# Altium integrated library CbyP.IntLib: 1144 symbols (part 3 of 6) (continued)
## CC0603JRNPO9BN560 (continued)
CAP CER 56pF 50V NP0 0603; Manufacturer: YAGEO; Mfr.Part #: CC0603JRNPO9BN560; Package: 0603; LCSC Part #: C107053
footprint CAP-0603
pins: 1, 2

## CC0603JRNPO9BN561
designator C?, comment 560pF
560pF ±5% 50V Ceramic Capacitor NP0 0603; Manufacturer: YAGEO; Mfr.Part #: CC0603JRNPO9BN561; Package: 0603; LCSC Part #: C107054; DigiKey Part Number: 311-3359-2-ND; ComponentLink1Description: Link; ComponentLink1URL: https://www.lcsc.com/product-detail/C107054.html?s_z=n_560PF; ComponentLink2Description: Link 1; ComponentLink2URL: https://www.digikey.com/en/products/detail/yageo/CC0603JRNPO9BN561/5883620?s=N4IgTCBcDaIMJwAwDZEGYBSAlAcgBQHkBOAIRwFZkBGEAXQF8g
footprint CAP-0603
pins: 1, 2

## CC0603JRNPO9BN750
designator C?, comment 75pF
75pF ±5% 50V Ceramic Capacitor NP0 0603; Manufacturer: YAGEO; Mfr.Part #: CC0603JRNPO9BN750; Package: 0603; LCSC Part #: C282074; DigiKey Part Number: 311-3975-2-ND
footprint CAP-0603
pins: 1, 2

## CC0603JRX7R9BB103
designator C?, comment 10nF
10nF ±5% 50V Ceramic Capacitor X7R 0603; Manufacturer: YAGEO; Mfr.Part #: CC0603JRX7R9BB103; Package: 0603; LCSC Part #: C115056; DigiKey Part Number: 311-1778-2-ND; ComponentLink1Description: Link; ComponentLink1URL: https://www.lcsc.com/product-detail/C115056.html?s_z=n_C115056; ComponentLink2Description: Link 1; ComponentLink2URL: https://www.digikey.com/en/products/detail/yageo/CC0603JRX7R9BB103/5195187?s=N4IgTCBcDaIMJwAwDZEGYBSAlAGgdiwE4AhYgRnRAF0BfIA
footprint CAP-0603
footprint CAP-0603-2
pins: 1, 2

## CC0603JRX7R9BB104
designator C?, comment 100nF
50V 100nF X7R ±5% 0603 Multilayer Ceramic Capacitors MLCC - SMD/SMT ROHS; Manufacturer: YAGEO; Mfr.Part #: CC0603JRX7R9BB104; Package: 0603; LCSC Part #: C14664
footprint CAP-0603
pins: 1, 2

## CC0603JRX7R9BB224
designator C?, comment 220nF
220nF ±5% 50V Ceramic Capacitor X7R 0603; Manufacturer: YAGEO; Mfr.Part #: CC0603JRX7R9BB224; Package: 0603; LCSC Part #: C519575; DigiKey Part Number: 13-CC0603JRX7R9BB224TR-ND; ComponentLink1Description: Link; ComponentLink1URL: https://www.lcsc.com/product-detail/C519575.html?s_z=n_CC0603JRX7R9BB224; ComponentLink2Description: Link 1; ComponentLink2URL: https://www.digikey.com/en/products/detail/yageo/CC0603JRX7R9BB224/11490865?s=N4IgTCBcDaIMJwAwDZEGYBSAlAGgdiwE4AhYsMAFhAF0BfIA
footprint CAP-0603
pins: 1, 2

## CC0603KRX5R6BB475
designator C?, comment 4.7uF
10V 4.7uF X5R ±10% 0603 Multilayer Ceramic Capacitors MLCC - SMD/SMT ROHS; Manufacturer: YAGEO; Mfr.Part #: CC0603KRX5R6BB475; Package: 0603; LCSC Part #: C109456
footprint CAP-0603
pins: 1, 2

## CC0603KRX5R7BB225
designator C?, comment 2.2uF
16V 2.2uF X5R ±10% 0603 Multilayer Ceramic Capacitors MLCC - SMD/SMT ROHS; Manufacturer: YAGEO; Mfr.Part #: CC0603KRX5R7BB225; Package: 0603; LCSC Part #: C106853; DigiKey Part Number: 311-1784-2-ND
footprint CAP-0603
pins: 1, 2

## CC0603KRX5R8BB105
designator C?, comment 1uF
1uF ±10% 25V Ceramic Capacitor X5R 0603; Manufacturer: YAGEO; Mfr.Part #: CC0603KRX5R8BB105; Package: 0603; LCSC Part #: C14664; DigiKey Part Number: 311-1445-2-ND; ComponentLink1Description: Link; ComponentLink1URL: https://www.lcsc.com/product-detail/C14664.html?s_z=n_C14664; ComponentLink2Description: Link 1; ComponentLink2URL: https://www.digikey.com/en/products/detail/yageo/CC0603KRX5R8BB105/2833610?s=N4IgTCBcDaIMJwAwDZEGYDSAlAGgViwA4AhYgRkTxAF0BfIA
footprint CAP-0603
pins: 1, 2

## CC0603KRX5R8BB225
designator C?, comment 2.2uF
CAP CER 2.2uF 25V X5R 0603; Manufacturer: YAGEO; Mfr.Part #: CC0603JRX7R9BB224; Package: 0603; LCSC Part #: C309478; DigiKey Part Number: 13-CC0603JRX7R9BB224TR-ND; ComponentLink1Description: Link; ComponentLink1URL: https://www.lcsc.com/product-detail/C309478.html?s_z=n_C309478; ComponentLink2Description: Link 1; ComponentLink2URL: https://www.digikey.com/en/products/detail/yageo/CC0603JRX7R9BB224/11490865?s=N4IgTCBcDaIMJwAwDZEGYBSAlAGgdiwE4AhYsMAFhAF0BfIA
footprint CAP-0603
pins: 1, 2

## CC0603KRX7R8BB684
designator C?, comment 680nF
680nF ±10% 25V Ceramic Capacitor X7R 0603; Manufacturer: YAGEO; Mfr.Part #: CC0603KRX7R8BB684; Package: 0603; LCSC Part #: C2838708
footprint CAP-0603
pins: 1, 2

## CC0603KRX7R9BB102
designator C?, comment 1nF
1nF ±10% 50V Ceramic Capacitor X7R 0603; Manufacturer: YAGEO; Mfr.Part #: CC0603KRX7R9BB102; Package: 0603; LCSC Part #: C100040; DigiKey Part Number: 311-1080-2-ND; ComponentLink1Description: Link; ComponentLink1URL: https://www.lcsc.com/product-detail/C100040.html?s_z=n_C100040; ComponentLink2Description: Link 1; ComponentLink2URL: https://www.digikey.com/en/products/detail/yageo/CC0603KRX7R9BB102/302814?s=N4IgTCBcDaIMJwAwDZEGYDSAlAGgdiwE4AhYgRkQgF0BfIA
footprint CAP-0603
pins: 1, 2

## CC0603KRX7R9BB104
designator C?, comment 100nF
100nF ±10% 50V Ceramic Capacitor X7R 0603; Manufacturer: YAGEO; Mfr.Part #: CC0603KRX7R9BB104; Package: 0603; LCSC Part #: C14663; DigiKey Part Number: 311-1344-2-ND; ComponentLink1Description: Link; ComponentLink1URL: https://www.lcsc.com/product-detail/C14663.html?s_z=n_C14663; ComponentLink2Description: Link 1; ComponentLink2URL: https://www.digikey.com/en/products/detail/yageo/CC0603KRX7R9BB104/2103082?s=N4IgTCBcDaIMwEYEFoFwCzuWZA5AIiALoC%2BQA
footprint CAP-0603
pins: 1, 2

## CC0603KRX7R9BB105
designator C?, comment 1uF
1uF ±10% 50V Ceramic Capacitor X7R 0603; Manufacturer: YAGEO; Mfr.Part #: CC0603KRX7R9BB105; Package: 0603; LCSC Part #: C559769; DigiKey Part Number: 311-2082-2-ND; ComponentLink1Description: Link; ComponentLink1URL: https://www.lcsc.com/product-detail/C559769.html?s_z=n_CC0603KRX7R9BB105; ComponentLink2Description: Link 1; ComponentLink2URL: https://www.digikey.com/en/products/detail/yageo/CC0603KRX7R9BB105/5883796?s=N4IgTCBcDaIMJwAwDZEGYDSAlAGgdiwE4AhYgRkQFYQBdAXyA
footprint CAP-0603
pins: 1, 2

## CC0603KRX7R9BB333
designator C?, comment 33nF
33nF ±10% 50V Ceramic Capacitor X7R 0603; Manufacturer: YAGEO; Mfr.Part #: CC0603KRX7R9BB333; Package: 0603; LCSC Part #: C106856; DigiKey Part Number: 311-1429-2-ND; ComponentLink1Description: Link; ComponentLink1URL: https://www.lcsc.com/product-detail/C106856.html?s_z=n_CC0603KRX7R9BB333; ComponentLink2Description: Link 1; ComponentLink2URL: https://www.digikey.com/en/products/detail/yageo/CC0603KRX7R9BB333/2833594?s=N4IgTCBcDaIMJwAwDZEGYDSAlAGgdiwE4AhYtckAXQF8g
footprint CAP-0603
pins: 1, 2

## CC0603KRX7R9BB473
designator C?, comment 47nF
47nF ±10% 50V Ceramic Capacitor X7R 0603; Manufacturer: Samsung Electro-Mechanics; Mfr.Part #: CC0603KRX7R9BB473; Package: 0603; LCSC Part #: C107093; DigiKey Part Number: 311-1427-2-ND; ComponentLink1Description: Link; ComponentLink1URL: https://www.lcsc.com/product-detail/C107093.html?s_z=n_47NF; ComponentLink2Description: Link 1; ComponentLink2URL: https://www.digikey.com/en/products/detail/yageo/CC0603KRX7R9BB473/2833592?s=N4IgTCBcDaIMJwAwDZEGYDSAlAGgdiwE4AhYgFjzRAF0BfIA
footprint CAP-0603
pins: 1, 2

## CC0603KRX7R9BB562
designator C?, comment 5.6nF
5.6nF ±10% 50V Ceramic Capacitor X7R 0603; Manufacturer: YAGEO; Mfr.Part #: CC0603KRX7R9BB562; Package: 0603; LCSC Part #: C107095; DigiKey Part Number: 311-1810-2-ND; ComponentLink1Description: Link; ComponentLink1URL: https://www.lcsc.com/product-detail/C107095.html?s_z=n_5600PF; ComponentLink2Description: Link 1; ComponentLink2URL: https://www.digikey.com/en/products/detail/yageo/CC0603KRX7R9BB562/5195217?s=N4IgTCBcDaIMJwAwDZEGYDSAlAGgdiwE4AhYgVmQgF0BfIA
footprint CAP-0603
pins: 1, 2

## CC0603KRX7R9BB563
designator C?, comment 56nF
56nF ±10% 50V Ceramic Capacitor X7R 0603; Manufacturer: YAGEO; Mfr.Part #: CC0603KRX7R9BB563; Package: 0603; LCSC Part #: C282072; DigiKey Part Number: 311-4100-2-ND; ComponentLink1Description: Link; ComponentLink1URL: https://www.lcsc.com/product-detail/C282072.html?s_z=n_56NF; ComponentLink2Description: Link 1; ComponentLink2URL: https://www.digikey.com/en/products/detail/yageo/CC0603KRX7R9BB563/5883809?s=N4IgTCBcDaIMJwAwDZEGYDSAlAGgdiwE4AhYgVmTRAF0BfIA
footprint CAP-0603
pins: 1, 2

## CC0603KRX7R9BB823
designator C?, comment 82nF
82nF ±10% 50V Ceramic Capacitor X7R 0603; Manufacturer: YAGEO; Mfr.Part #: CC0603KRX7R9BB823; Package: 0603; LCSC Part #: C107100; DigiKey Part Number: 311-4102-2-ND; ComponentLink1Description: Link; ComponentLink1URL: https://www.lcsc.com/product-detail/C107100.html?s_z=n_0.082UF; ComponentLink2Description: Link 1; ComponentLink2URL: https://www.digikey.com/en/products/detail/yageo/CC0603KRX7R9BB823/5883812?s=N4IgTCBcDaIMJwAwDZEGYDSAlAGgdiwE4AhYgDjDRAF0BfIA
footprint CAP-0603
pins: 1, 2

## CC0603ZRY5V6BB105
designator C?, comment 1uF
1uF -20%~+80% 10V Ceramic Capacitor Y5V 0603; Manufacturer: YAGEO; Mfr.Part #: CC0603ZRY5V6BB105; Package: 0603; LCSC Part #: C106220; DigiKey Part Number: 311-1357-2-ND; ComponentLink1Description: Link; ComponentLink1URL: https://www.lcsc.com/product-detail/C106220.html?s_z=n_C106220; ComponentLink2Description: Link 1; ComponentLink2URL: https://www.digikey.com/en/products/detail/yageo/CC0603ZRY5V6BB105/2103095?s=N4IgTCBcDaIMJwAwDZEGYBaAlAmgVgDVkAhYgRkTxAF0BfIA
footprint CAP-0603
pins: 1, 2

## CC0805JRNPO9BN220
designator C?, comment 22pF
22pF ±5% 50V Ceramic Capacitor NP0 0805; Manufacturer: YAGEO; Mfr.Part #: CC0805JRNPO9BN220; Package: 0805; LCSC Part #: C105623; DigiKey Part Number: 311-1103-2-ND
footprint CAP-0805
footprint CAP-0805-1
pins: 1, 2

## CC0805KKX7R7BB475
designator C?, comment 4.7uF
4.7uF ±10% 16V Ceramic Capacitor X7R 0805; Manufacturer: YAGEO; Mfr.Part #: CC0805KKX7R7BB475; Package: 0805; LCSC Part #: C277499; DigiKey Part Number: 311-1883-2-ND
footprint CAP-0805
footprint CAP-0805-1
pins: 1, 2

## CC0805KRX7R9BB103
designator C?, comment 10nF
10nF ±10% 50V Ceramic Capacitor X7R 0805; Manufacturer: YAGEO; Mfr.Part #: CC0805KRX7R9BB103; Package: 0805; LCSC Part #: C83170; DigiKey Part Number: 311-1136-2-ND
footprint CAP-0805
footprint CAP-0805-1
pins: 1, 2

## CC0805KRX7R9BB104
designator C?, comment 100nF
50V 100nF X7R ±10% 0805 Multilayer Ceramic Capacitors MLCC - SMD/SMT ROHS; Manufacturer: YAGEO; Mfr.Part #: CC0805KRX7R9BB104; Package: 0805; LCSC Part #: C49678; DigiKey Part Number: 311-1140-2-ND
footprint CAP-0805
footprint CAP-0805-1
pins: 1, 2

## CC1206JKNPOCBN101
designator C?, comment 100pF
100pF ±5% 1kV Ceramic Capacitor NP0 1206; Manufacturer: YAGEO; Mfr.Part #: CC1206JKNPOCBN101; Package: 1206; LCSC Part #: C107173; DigiKey Part Number: 311-1493-2-ND
footprint CAP-1206 - 1
pins: 1, 2

## CC1206KKX7R0BB224
designator C?, comment 220nF
220nF ±10% 100V Ceramic Capacitor X7R 1206; Manufacturer: YAGEO; Mfr.Part #: CC1206KKX7R0BB224; Package: 1206; LCSC Part #: C113892; DigiKey Part Number: 311-3399-2-ND; ComponentLink1Description: Link; ComponentLink1URL: https://www.lcsc.com/product-detail/C113892.html; ComponentLink2Description: Link 1; ComponentLink2URL: https://www.digikey.com/en/products/detail/yageo/CC1206KKX7R0BB224/5884562?s=N4IgTCBcDaIMJwIxgAwDYDSGAaB2ASigEJFhgAsIAugL5A
footprint CAP-1206 - 1
pins: 1, 2

## CC1206KKX7RCBB222
designator C?, comment 2.2nF
CAP CER 2.2nF 1kV X7R 1206; Manufacturer: YAGEO; Mfr.Part #: CC1206KKX7RCBB222; Package: 1206; LCSC Part #: C107194
footprint CAP-1206 - 1
pins: 1, 2

## CC1206KKX7RDBB102
designator C?, comment 1nF
1nF ±10% 2kV Ceramic Capacitor X7R 1206; Manufacturer: YAGEO; Mfr.Part #: CC1206KKX7RDBB102; Package: 1206; LCSC Part #: C23631; DigiKey Part Number: 311-1487-2-ND; ComponentLink1Description: Link; ComponentLink1URL: https://www.lcsc.com/product-detail/C23631.html?s_z=n_q_C23631&globalKeyword=C23631; ComponentLink2Description: Link 1; ComponentLink2URL: https://www.digikey.com/en/products/detail/yageo/CC1206KKX7RDBB102/2833652?s=N4IgTCBcDaIMJwIxgAwDYDSGAaB2ASgCIBCxiKEAugL5A
footprint CAP-1206 - 1
pins: 1, 2

## CC1206KRX7R9BB104
designator C?, comment 100nF
100nF ±10% 50V Ceramic Capacitor X7R 1206; Manufacturer: YAGEO; Mfr.Part #: CC1206KRX7R9BB104; Package: 1206; LCSC Part #: C82601; DigiKey Part Number: 311-1179-2-ND
footprint CAP-1206 - 1
pins: 1, 2

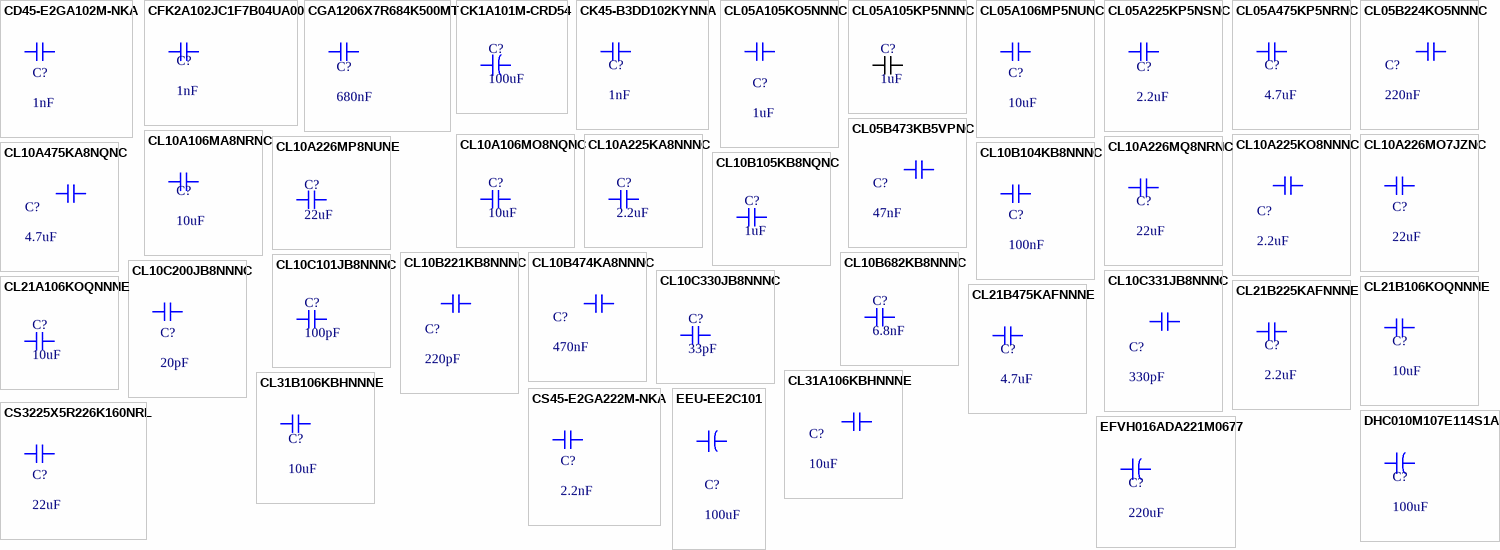
[diagram p16: symbols CD45-E2GA102M-NKA to EFVH016ADA221M0677]

## CD45-E2GA102M-NKA
designator C?, comment 1nF
CAP SAFETY 1nF ±20% 440V 400V TH; Manufacturer: TDK; Mfr.Part #: CD45-E2GA102M-NKA; Package: Through Hole,P=10mm; LCSC Part #: C360355
footprint Through Hole, P=7.5mm, D=8mm, T=5mm
pins: 1, 2

## CFK2A102JC1F7B04UA00
designator C?, comment 1nF
±5% 100V 1nF Through Hole,P=5.08mm Film Capacitors ROHS; Manufacturer: Dersonic; Mfr.Part #: CFK2A102JC1F7B04UA00; Package: Through Hole,P=5.08mm; LCSC Part #: C22439655
footprint Through Hole, P=5.08mm, L=7.2mm, W=2.5mm, H=6.5mm
pins: 1, 2

## CGA1206X7R684K500MT
designator C?, comment 680nF
680nF ±10% 50V Ceramic Capacitor X7R 1206; Manufacturer: HRE; Mfr.Part #: CGA1206X7R684K500MT; Package: 1206; LCSC Part #: C22440595; DigiKey Part Number: NO
footprint CAP-1206 - 1
pins: 1, 2

## CK1A101M-CRD54
designator C?, comment 100uF
100uF ±20% 10V Aluminum Electrolytic Capacitors 2000hrs@105℃; Manufacturer: ROQANG; Mfr.Part #: CK1A101M-CRD54; Package: SMD,D5xL5.4mm; LCSC Part #: C3001231; DigiKey Part Number: NO
footprint SMD,D5xL5.5mm
pins: 1, 2

## CK45-B3DD102KYNNA
designator C?, comment 1nF
CAP CER 1nF 2kV TH; Manufacturer: TDK; Mfr.Part #: CK45-B3DD102KYNNA; Package: Through Hole,P=5mm; LCSC Part #: C97722
footprint Through Hole, P=5mm, D=7.5mm, T=5mm
pins: 1, 2

## CL05A105KO5NNNC
designator C?, comment 1uF
16V 1uF X5R ±10% 0402 Ceramic Capacitors ROHS; Manufacturer: Samsung Electro-Mechanics; Mfr.Part #: CL05A105KO5NNNC; Package: 0402; LCSC Part #: C29266; DigiKey Part Number: 1276-1067-2-ND
footprint CAP-0402
pins: 1, 2

## CL05A105KP5NNNC
designator C?, comment 1uF
10V 1uF X5R ±10% 0402 Multilayer Ceramic Capacitors MLCC - SMD/SMT ROHS; Manufacturer: Samsung Electro-Mechanics; Mfr.Part #: CL05A105KP5NNNC; Package: 0402; LCSC Part #: C14445
footprint CAP-0402
pins: 1, 2

## CL05A106MP5NUNC
designator C?, comment 10uF
10V 10uF X5R ±20% 0402 Multilayer Ceramic Capacitors MLCC - SMD/SMT ROHS; Manufacturer: Samsung Electro-Mechanics; Mfr.Part #: CL05A106MP5NUNC; Package: 0402; LCSC Part #: C315248; DigiKey Part Number: 1276-1450-2-ND
footprint CAP-0402
pins: 1, 2

## CL05A225KP5NSNC
designator C?, comment 2.2uF
10V 2.2uF X5R ±10% 0402 Ceramic Capacitors RoHS; Manufacturer: Samsung Electro-Mechanics; Mfr.Part #: CL05A225KP5NSNC; Package: 0402; LCSC Part #: C107369; DigiKey Part Number: 1276-1108-2-ND
footprint CAP-0402
pins: 1, 2

## CL05A475KP5NRNC
designator C?, comment 4.7uF
10V 4.7uF X5R ±10% 0402 Multilayer Ceramic Capacitors MLCC - SMD/SMT ROHS; Manufacturer: Samsung Electro-Mechanics; Mfr.Part #: CL05A475KP5NRNC; Package: 0402; LCSC Part #: C368809; DigiKey Part Number: 1276-1480-2-ND
footprint CAP-0402
pins: 1, 2

## CL05B224KO5NNNC
designator C?, comment 220nF
220nF ±10% 16V Ceramic Capacitor X7R 0402; Manufacturer: Samsung Electro-Mechanics; Mfr.Part #: CL05B224KO5NNNC; Package: 0402; LCSC Part #: C16772; DigiKey Part Number: 1276-1176-2-ND; ComponentLink1Description: Link; ComponentLink1URL: https://www.lcsc.com/product-detail/C16772.html?s_z=n_220NF; ComponentLink2Description: Link 1; ComponentLink2URL: https://www.digikey.com/en/products/detail/samsung-electro-mechanics/CL05B224KO5NNNC/3886834?s=N4IgTCBcDaIMIBkAMBWAQmMAWA0geRQDli4QBdAXyA
footprint CAP-0402
pins: 1, 2

## CL05B473KB5VPNC
designator C?, comment 47nF
47nF ±10% 50V Ceramic Capacitor X7R 0402; Manufacturer: muRata; Mfr.Part #: CL05B473KB5VPNC; Package: 0402; LCSC Part #: C307339; DigiKey Part Number: 1276-CL05B473KB5VPNCTR-ND; ComponentLink1Description: Link; ComponentLink1URL: https://www.lcsc.com/product-detail/C307339.html; ComponentLink2Description: Link 1; ComponentLink2URL: https://www.digikey.com/en/products/detail/samsung-electro-mechanics/CL05B473KB5VPNC/11487772?s=N4IgTCBcDaIMIBkAMBWAQgFgOwGYDSaKAagAoBycIAugL5A
footprint CAP-0402
pins: 1, 2

## CL10A106MA8NRNC
designator C?, comment 10uF
10uF ±20% 25V Ceramic Capacitor X5R 0603; Manufacturer: Samsung Electro-Mechanics; Mfr.Part #: CL10A106MA8NRNC; Package: 0603; LCSC Part #: C96446; DigiKey Part Number: 1276-1869-2-ND; ComponentLink1Description: Link; ComponentLink1URL: https://www.lcsc.com/product-detail/C96446.html?s_z=n_CL10A106MA8NRNC; ComponentLink2Description: Link 1; ComponentLink2URL: https://www.digikey.com/en/products/detail/samsung-electro-mechanics/CL10A106MA8NRNC/3887527?s=N4IgTCBcDaIMIBkCMAGAgqgbAWTQDgDkAlAuEAXQF8g
footprint CAP-0603
pins: 1, 2

## CL10A106MO8NQNC
designator C?, comment 10uF
16V 10uF X5R ±20% 0603 Multilayer Ceramic Capacitors MLCC - SMD/SMT ROHS; Manufacturer: Samsung Electro-Mechanics; Mfr.Part #: CL10A106MO8NQNC; Package: 0603; LCSC Part #: C92487; DigiKey Part Number: 1276-1870-2-ND; ComponentLink1Description: Link; ComponentLink1URL: https://www.lcsc.com/product-detail/C92487.html?s_z=n_C92487; ComponentLink2Description: Link 1; ComponentLink2URL: https://www.digikey.com/en/products/detail/samsung-electro-mechanics/CL10A106MO8NQNC/3887528?s=N4IgTCBcDaIMIBkCMAGAgqgbAWQPIA4A5ARULhAF0BfIA
footprint CAP-0603
pins: 1, 2

## CL10A225KA8NNNC
designator C?, comment 2.2uF
2.2uF ±10% 25V Ceramic Capacitor X5R 0603; Manufacturer: Samsung Electro-Mechanics; Mfr.Part #: CL10A225KA8NNNC; Package: 0603; LCSC Part #: C57895; DigiKey Part Number: 1276-1879-2-ND; ComponentLink1Description: Link; ComponentLink1URL: https://www.lcsc.com/product-detail/C57895.html?s_z=n_CL10A225KA8NNNC; ComponentLink2Description: Link 1; ComponentLink2URL: https://www.digikey.com/en/products/detail/samsung-electro-mechanics/CL10A225KA8NNNC/3887537?s=N4IgTCBcDaIMIBkCMAGAgmMBWA0mgHAHLFwgC6AvkA
footprint CAP-0603
pins: 1, 2

## CL10A225KO8NNNC
designator C?, comment 2.2uF
2.2uF ±10% 16V Ceramic Capacitor X5R 0603; Manufacturer: Samsung Electro-Mechanics; Mfr.Part #: CL10A225KO8NNNC; Package: 0603; LCSC Part #: C23630; DigiKey Part Number: 1276-1040-2-ND; ComponentLink1Description: Link; ComponentLink1URL: https://www.lcsc.com/product-detail/C23630.html?s_z=n_CL10A225KO8NNNC; ComponentLink2Description: Link 1; ComponentLink2URL: https://www.digikey.com/en/products/detail/samsung-electro-mechanics/CL10A225KO8NNNC/3886698?s=N4IgTCBcDaIMIBkCMAGAgmMBWA0geQA4A5EuEAXQF8g
footprint CAP-0603
pins: 1, 2

## CL10A226MO7JZNC
designator C?, comment 22uF
16V 22uF X5R ±20% 0603 Ceramic Capacitors ROHS; Manufacturer: Samsung Electro-Mechanics; Mfr.Part #: CL10A226MO7JZNC; Package: 0603; LCSC Part #: C2762594; DigiKey Part Number: 1276-7076-2-ND
footprint CAP-0603
pins: 1, 2

## CL10A226MP8NUNE
designator C?, comment 22uF
10V 22uF X5R ±20% 0603 Multilayer Ceramic Capacitors MLCC - SMD/SMT ROHS; Manufacturer: Samsung Electro-Mechanics; Mfr.Part #: CL10A226MP8NUNE; Package: 0603; LCSC Part #: C86295; DigiKey Part Number: 1276-1274-2-ND
footprint CAP-0603
pins: 1, 2

## CL10A226MQ8NRNC
designator C?, comment 22uF
6.3V 22uF X5R ±20% 0603 Multilayer Ceramic Capacitors MLCC - SMD/SMT ROHS; Manufacturer: Samsung Electro-Mechanics; Mfr.Part #: CL10A226MQ8NRNC; Package: 0603; DigiKey Part Number: 1276-1193-2-ND; LCSC Part #: C59461
footprint CAP-0603
pins: 1, 2

## CL10A475KA8NQNC
designator C?, comment 4.7uF
4.7uF ±10% 25V Ceramic Capacitor X5R 0603; Manufacturer: Samsung Electro-Mechanics; Mfr.Part #: CL10A475KA8NQNC; Package: 0603; LCSC Part #: C69335; DigiKey Part Number: 1276-1900-2-ND; ComponentLink1Description: Link; ComponentLink1URL: https://www.lcsc.com/product-detail/C69335.html; ComponentLink2Description: Link 1; ComponentLink2URL: https://www.digikey.com/en/products/detail/samsung-electro-mechanics/CL10A475KA8NQNC/3887558?s=N4IgTCBcDaIMIBkCMAGAggFgOwFYDSaAHAHICKxcIAugL5A
footprint CAP-0603
pins: 1, 2

## CL10B104KB8NNNC
designator C?, comment 100nF
100nF ±10% 50V Ceramic Capacitor X7R 0603; Manufacturer: Samsung Electro-Mechanics; Mfr.Part #: CL10B104KB8NNNC; Package: 0603; LCSC Part #: C1591; DigiKey Part Number: 1276-1000-2-ND; ComponentLink1Description: Link; ComponentLink1URL: https://www.lcsc.com/product-detail/C1591.html?s_z=n_CL10B104KB8NNC; ComponentLink2Description: Link 1; ComponentLink2URL: https://www.digikey.com/en/products/detail/samsung-electro-mechanics/CL10B104KB8NNNC/3886658?s=N4IgTCBcDaIMIBkCMAGAQqgLAaTQDgDki4QBdAXyA
footprint CAP-0603
footprint CAP-0603-3
pins: 1, 2

## CL10B105KB8NQNC
designator C?, comment 1uF
1uF ±10% 50V Ceramic Capacitor X7R 0603; Manufacturer: Samsung Electro-Mechanics; Mfr.Part #: CL10B105KB8NQNC; Package: 0603; LCSC Part #: C5199872; DigiKey Part Number: NO; ComponentLink1Description: Link; ComponentLink1URL: https://www.lcsc.com/product-detail/C5199872.html; ComponentLink2Description: Link 1
footprint CAP-0603
pins: 1, 2

## CL10B221KB8NNNC
designator C?, comment 220pF
220pF ±10% 50V Ceramic Capacitor X7R 0603; Manufacturer: Samsung Electro-Mechanics; Mfr.Part #: CL10B221KB8NNNC; Package: 0603; LCSC Part #: C1603; DigiKey Part Number: 1276-1145-2-ND; ComponentLink1Description: Link; ComponentLink1URL: https://www.lcsc.com/product-detail/C1603.html?s_z=n_220PF; ComponentLink2Description: Link 1; ComponentLink2URL: https://www.digikey.com/en/products/detail/samsung-electro-mechanics/CL10B221KB8NNNC/3886803?s=N4IgTCBcDaIMIBkCMAGAQmMSDSaAcAckXCALoC%2BQA
footprint CAP-0603
pins: 1, 2

## CL10B474KA8NNNC
designator C?, comment 470nF
470nF ±10% 25V Ceramic Capacitor X7R 0603; Manufacturer: Samsung Electro-Mechanics; Mfr.Part #: CL10B474KA8NNNC; Package: 0603; LCSC Part #: C1623; DigiKey Part Number: 1276-2083-2-ND; ComponentLink1Description: Link; ComponentLink1URL: https://www.lcsc.com/product-detail/C1623.html?s_z=n_470NF; ComponentLink2Description: Link 1; ComponentLink2URL: https://www.digikey.com/en/products/detail/samsung-electro-mechanics/CL10B474KA8NNNC/3887741?s=N4IgTCBcDaIMIBkCMAGAQgFgOwYNIEEAOAOVLhAF0BfIA
footprint CAP-0603
pins: 1, 2

## CL10B682KB8NNNC
designator C?, comment 6.8nF
6.8nF ±10% 50V Ceramic Capacitor X7R 0603; Manufacturer: Samsung Electro-Mechanics; Mfr.Part #: CL10B682KB8NNNC; Package: 0603; LCSC Part #: C84723; DigiKey Part Number: 1276-1185-2-ND; ComponentLink1Description: Link; ComponentLink1URL: https://www.lcsc.com/product-detail/C84723.html?s_z=n_CL10B682KB; ComponentLink2Description: Link 1; ComponentLink2URL: https://www.digikey.com/en/products/detail/samsung-electro-mechanics/CL10B682KB8NNNC/3886843?s=N4IgTCBcDaIMIBkCMAGAQgNgBxgNJqwDli4QBdAXyA
footprint CAP-0603
pins: 1, 2

## CL10C101JB8NNNC
designator C?, comment 100pF
100pF ±5% 50V Ceramic Capacitor C0G 0603; Manufacturer: Samsung Electro-Mechanics; Mfr.Part #: CL10C101JB8NNNC; Package: 0603; LCSC Part #: C14858; DigiKey Part Number: 1276-1008-2-ND; ComponentLink1Description: Link; ComponentLink1URL: https://www.lcsc.com/product-detail/C14858.html?s_z=n_CL10C101JBNNNC; ComponentLink2Description: Link 1; ComponentLink2URL: https://www.digikey.com/en/products/detail/samsung-electro-mechanics/CL10C101JB8NNNC/3886666?s=N4IgTCBcDaIMIBkCMAGOqkCkBCAOAcoXCALoC%2BQA
footprint CAP-0603
pins: 1, 2

## CL10C200JB8NNNC
designator C?, comment 20pF
20pF ±5% 50V Ceramic Capacitor C0G 0603; Manufacturer: Samsung Electro-Mechanics; Mfr.Part #: CL10C200JB8NNNC; Package: 0603; LCSC Part #: C1648; DigiKey Part Number: 1276-1187-2-ND; ComponentLink1Description: Link; ComponentLink1URL: https://www.lcsc.com/product-detail/C1648.html?s_z=n_20pf; ComponentLink2Description: Link 1; ComponentLink2URL: https://www.digikey.com/en/products/detail/samsung-electro-mechanics/CL10C200JB8NNNC/3886845?s=N4IgTCBcDaIMIBkCMAGOYUoFICEAcAckXCALoC%2BQA
footprint CAP-0603
pins: 1, 2

## CL10C330JB8NNNC
designator C?, comment 33pF
33pF ±5% 50V Ceramic Capacitor C0G 0603; Manufacturer: Samsung Electro-Mechanics; Mfr.Part #: CL10C330JB8NNNC; Package: 0603; LCSC Part #: C1663; DigiKey Part Number: 1276-1070-2-ND; ComponentLink1Description: Link; ComponentLink1URL: https://www.lcsc.com/product-detail/C1663.html?s_z=n_CL10C330JB; ComponentLink2Description: Link 1; ComponentLink2URL: https://www.digikey.com/en/products/detail/samsung-electro-mechanics/CL10C330JB8NNNC/3886728?s=N4IgTCBcDaIMIBkCMAGOBmdKBSAhAHAHLFwgC6AvkA
footprint CAP-0603
pins: 1, 2

## CL10C331JB8NNNC
designator C?, comment 330pF
330pF ±5% 50V Ceramic Capacitor C0G 0603; Manufacturer: Samsung Electro-Mechanics; Mfr.Part #: CL10C331JB8NNNC; Package: 0603; LCSC Part #: C1664; DigiKey Part Number: 1276-1073-2-ND
footprint CAP-0603
pins: 1, 2

## CL21A106KOQNNNE
designator C?, comment 10uF
10uF ±10% 16V Ceramic Capacitor X5R 0805; Manufacturer: Samsung Electro-Mechanics; Mfr.Part #: CL21A106KOQNNNE; Package: 0805; LCSC Part #: C1713; DigiKey Part Number: 1276-1096-2-ND; ComponentLink1Description: Link; ComponentLink1URL: https://www.lcsc.com/product-detail/C1713.html?s_z=n_CL21A106KOQNNNE; ComponentLink2Description: Link 1; ComponentLink2URL: https://www.digikey.com/en/products/detail/samsung-electro-mechanics/CL21A106KOQNNNE/3886754?s=N4IgTCBcDaIMIBkwEYCCyAMA2A0geQEUA5EgURAF0BfIA
footprint CAP-0805-1
pins: 1, 2

## CL21B106KOQNNNE
designator C?, comment 10uF
CAP CER 10uF 16V X7R 0805; Manufacturer: Samsung Electro-Mechanics; Mfr.Part #: CL21B106KOQNNNE; Package: 0805; LCSC Part #: C95841
footprint CAP-0805
footprint CAP-0805-1
pins: 1, 2

## CL21B225KAFNNNE
designator C?, comment 2.2uF
2.2uF ±10% 25V Ceramic Capacitor X7R 0805; Manufacturer: Samsung Electro-Mechanics; Mfr.Part #: CL21B225KAFNNNE; Package: 0805; LCSC Part #: C19110; DigiKey Part Number: 1276-2954-2-ND; ComponentLink1Description: Link; ComponentLink1URL: https://www.lcsc.com/product-detail/C19110.html; ComponentLink2Description: Link 1; ComponentLink2URL: https://www.digikey.com/en/products/detail/samsung-electro-mechanics/CL21B225KAFNNNE/3888612?s=N4IgTCBcDaIMIBkwEYBCYwFYDSBBAYgHLECiIAugL5A
footprint CAP-0805
footprint CAP-0805-1
pins: 1, 2

## CL21B475KAFNNNE
designator C?, comment 4.7uF